# Altium footprint library Connectors.PcbLib: 69 footprints (part 5 of 5)
Each footprint in its own frame and in the unit in brackets; x right, y up, seen from the top. Pads: shape width x height; smd on the part's side, far side on the other; paste and mask are expansions set on the pad; w line width, h text height; cw(c..) or ccw(c..) is an arc to the next point about the centre after c.
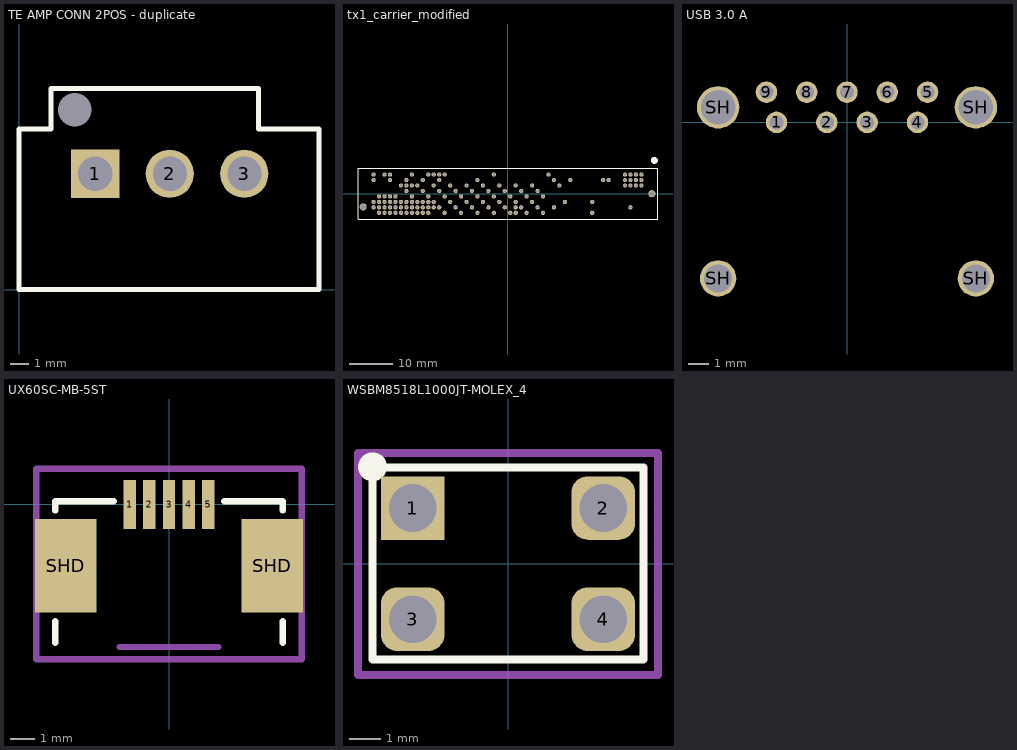
[diagram p4: the footprints below, top view; thin cyan lines are the x and y axes]

## TE AMP CONN 2POS - duplicate [mm] "CONN HEADER 3POS STR .156 TIN"
height 12
pads (4):
  rect 2.562x2.562 hole 1.81: 1(4.05,6.15)
  round 2.562 hole 1.81: 2(8.01,6.15) 3(11.97,6.15)
  round 0 hole 1.78: ""(2.97,9.55)
Top Overlay:
  lines w0.254: 0,0 15.936,0 15.936,8.534 12.723,8.534 12.723,10.681 1.702,10.681 1.702,8.534 0,8.534 0,0
3D body "c-1877285-3-c-3d.stp": height 12, standoff -3.62, extent 0.432,0.356 15.562,10.246

## tx1_carrier_modified [mil] "TX 1 carrier board connector modified to remove pads"
height 4.6
pads (129):
  round 39 hole 25: A1(1225,175) A2(1175,175) A3(1125,175) A4(1075,175) A18(375,175) A28(-125,175) A37(-575,175) A38(-625,175) A39(-675,175) A40(-725,175) A43(-875,175) A47(-1075,175) A48(-1125,175) A50(-1225,175) B1(1225,125) B2(1175,125) B3(1125,125) B4(1075,125) B7(925,125) B8(875,125) B14(575,125) B17(425,125) B31(-275,125) B38(-625,125) B41(-775,125) B44(-925,125) B47(-1075,125) B50(-1225,125) C1(1225,75) C2(1175,75) C3(1125,75) C4(1075,75) C16(475,75) C21(225,75) C24(75,75) C27(-75,75) C30(-225,75) C33(-375,75) C36(-525,75) C39(-675,75) C42(-825,75) C43(-875,75) C44(-925,75) C45(-975,75) D20(275,25) D23(125,25) D26(-25,25) D29(-175,25) D32(-325,25) D35(-475,25) D38(-625,25) D41(-775,25) D44(-925,25) E19(325,-25) E22(175,-25) E25(25,-25) E28(-125,-25) E31(-275,-25) E34(-425,-25) E37(-575,-25) E40(-725,-25) E43(-875,-25) E46(-1025,-25) E47(-1075,-25) E48(-1125,-25) E49(-1175,-25) F10(775,-75) F15(525,-75) F21(225,-75) F24(75,-75) F27(-75,-75) F30(-225,-75) F33(-375,-75) F36(-525,-75) F39(-675,-75) F40(-725,-75) F41(-775,-75) F42(-825,-75) F43(-875,-75) F44(-925,-75) F45(-975,-75) F46(-1025,-75) F47(-1075,-75) F48(-1125,-75) F49(-1175,-75) F50(-1225,-75) G3(1125,-125) G17(425,-125) G20(275,-125) G23(125,-125) G24(75,-125) G26(-25,-125) G29(-175,-125) G32(-325,-125) G35(-475,-125) G38(-625,-125) G39(-675,-125) G40(-725,-125) G41(-775,-125) G42(-825,-125) G43(-875,-125) G44(-925,-125) G45(-975,-125) G46(-1025,-125) G47(-1075,-125) G48(-1125,-125) G49(-1175,-125) G50(-1225,-125) H10(775,-175) H19(325,-175) H22(175,-175) H24(75,-175) H25(25,-175) H28(-125,-175) H31(-275,-175) H34(-425,-175) H37(-575,-175) H40(-725,-175) H41(-775,-175) H42(-825,-175) H43(-875,-175) H44(-925,-175) H45(-975,-175) H46(-1025,-175) H47(-1075,-175) H48(-1125,-175) H49(-1175,-175)
  round 65 hole 50: ""(-1320.5,-120) ""(1320.5,0)
Top Overlay:
  circle w32: c1344,305 r16.03
  lines w10: 1377,231 1377,-235 -1368,-235 -1368,233 1377,233
3D body "SEAM-50-02.0-S-08-2-A-K-TR.stp": height 218, standoff -53, extent -1348.5,-239.99 1382.5,238

## USB 3.0 A [mm] "0483930003"
height 6.86
pads (13):
  round 1.067 hole 0.7: 1(-3.5,0) 2(-1,0) 3(1,0) 4(3.5,0) 5(4,1.5) 6(2,1.5) 7(0,1.5) 8(-2,1.5) 9(-4,1.5)
  round 1.8 hole 1.4: SH(-6.4,-7.75) SH(6.4,-7.75)
  round 2.1 hole 1.7: SH(-6.4,0.75) SH(6.4,0.75)
3D body "483930003.stp": height 7, standoff -1.04, extent -6.9,-11.725 6.9,2.525

## UX60SC-MB-5ST [mm] "USB Mini-B Recepticle"
pads (7):
  rect 0.5x2 smd: 1(-1.6,0) 2(-0.8,0) 3(0,0) 4(0.8,0) 5(1.6,0)
  rect 2.5x3.8 smd: SHD(-4.2,-2.5) SHD(4.2,-2.5)
Top Overlay:
  lines w0.254: -4.625,-5.625 -4.625,-4.75 ; -4.625,-0.25 -4.625,0.125 -2.25,0.125 ; 2.25,0.125 4.625,0.125 4.625,-0.25 ; 4.625,-5.625 4.625,-4.75
Mechanical 1:
  lines w0.254: -2,-5.8 2,-5.8
Mechanical 15:
  lines w0.254: -5.4,-6.3 -5.4,1.45 5.4,1.45 5.4,-6.3 -5.4,-6.3
3D body "UX60SC-MB-5ST.stp": height 3.95, standoff 0, extent -4.9,-6.605 4.9,0.395

## WSBM8518L1000JT-MOLEX_4 [mm] "4 pins of molex type MX150 male to female connector"
pads (4):
  rect 2x2 hole 1.5: 1(-3,1.75)
  rrect50% 2x2 hole 1.5: 2(3,1.75) 3(-3,-1.75) 4(3,-1.75)
Top Overlay:
  circle w0.6: c-4.267,3.048 r0.154
  lines w0.254: -4.27,-3.02 -4.27,3.02 4.27,3.02 4.27,-3.02 -4.27,-3.02
Mechanical 15:
  lines w0.254: -4.724,-3.505 4.724,-3.505 4.724,3.48 -4.724,3.48 -4.724,-3.505